# Altium footprint library PcbLib.PcbLib: 142 footprints (part 6 of 9)
Each footprint in its own frame and in the unit in brackets; x right, y up, seen from the top. Pads: shape width x height; smd on the part's side, far side on the other; paste and mask are expansions set on the pad; w line width, h text height; cw(c..) or ccw(c..) is an arc to the next point about the centre after c.
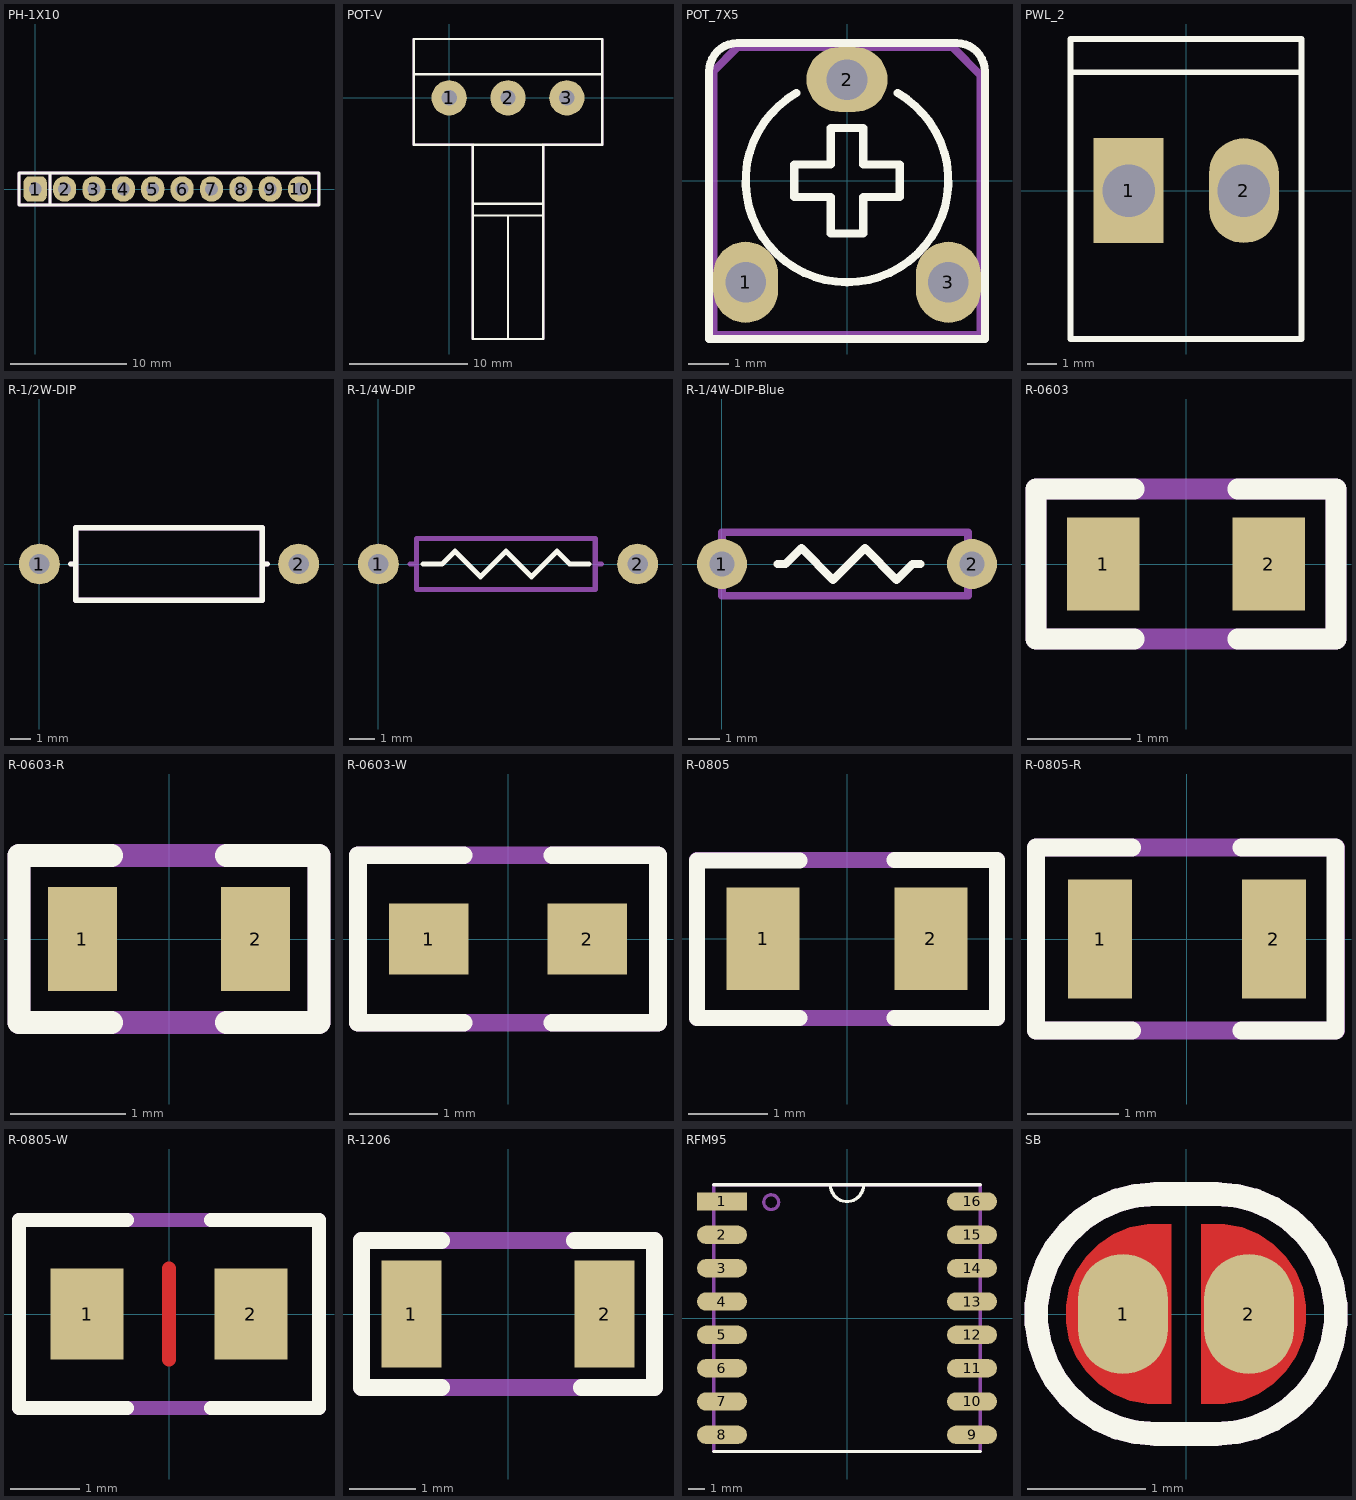
[diagram p5: the footprints below, top view; thin cyan lines are the x and y axes]

## PH-1X10 [mm] "2.54mm"
pads (10):
  rrect50% 2x2.2 hole 1.1: 1(0,0)
  oval 2x2.2 hole 1.1 mask+0.102: 2(2.54,0) 3(5.08,0) 4(7.62,0) 5(10.16,0) 6(12.7,0) 7(15.24,0) 8(17.78,0) 9(20.32,0) 10(22.86,0)
Top Overlay:
  lines w0.254: 1.275,-1.4 1.275,1.35 ; -1.4,-1.4 -1.4,1.4 24.536,1.4 24.536,-1.4 -1.4,-1.4
Mechanical 29:
  lines w0.254: 1.275,-1.4 1.275,1.35 ; -1.4,-1.4 24.511,-1.4 24.511,1.4 -1.4,1.4 -1.4,-1.4
  text ".Designator" at 3.9,-0.467 h1

## POT-V [mm]
pads (3):
  round 3 hole 1.3: 1(0,0) 2(5,0) 3(10,0)
Top Overlay:
  lines w0.2: -3,2 13,2 ; 2,-10 8,-10 ; 2,-4 2,-9 ; 5,-20.5 5,-10 ; 8,-4 8,-9 ; 2,-9 2,-20.5 8,-20.5 8,-9 ; 2,-9 8,-9 ; -3,-4 -3,5 13,5 13,-4 -3,-4
Mechanical 29:
  lines w0.2: -3,-4 2,-4 2,-20.5 8,-20.5 8,-4 13,-4 13,5 -3,5 -3,-4
  text ".Designator" at 3.2,-0.467 h1
3D body "User Library-Pot(2).STEP": height 21.14, standoff -3.5, extent -2.874,-20.632 12.874,4.926

## POT_7X5 [mm] "POT, TRIM, 7.5X5.0mm, pitch: 5.0mm"
pads (3):
  oval 1.6x2 hole 1: 1(-2.5,-2.5) 3(2.5,-2.5)
  oval 2x1.6 hole 1: 2(0,2.5)
Top Overlay:
  lines w0.2: -1.25,2.165 ccw(c0,0) 1.25,2.165 ; -3.4,-3.9 3.4,-3.9 3.4,2.7 ccw(c2.7,2.7) 2.7,3.4 -2.7,3.4 ccw(c-2.7,2.7) -3.4,2.7 -3.4,-3.9 ; -1.3,-0.4 -0.4,-0.4 -0.4,-1.3 0.4,-1.3 0.4,-0.4 1.3,-0.4 1.3,0.4 0.4,0.4 0.4,1.3 -0.4,1.3 -0.4,0.4 -1.3,0.4 -1.3,-0.4
Mechanical 29:
  lines w0.2: -3.3,-3.8 -3.3,2.7 -2.7,3.3 2.6,3.3 3.3,2.6 3.3,-3.8 -3.3,-3.8
  text ".Designator" at -1.3,-0.667 h1
3D body "User Library-Pot - RES_VAR1.STEP": height 7.5, standoff -3.4, extent -3.25,-3.775 3.25,3.275

## PWL_2 [mm] "Connector; Header; 2 Position"
height 0.001
pads (2):
  rect 2.4x3.6 hole 1.8: 1(-1.98,0)
  oval 2.4x3.6 hole 1.8: 2(1.98,0)
Top Overlay:
  lines w0.2: -3.98,4.064 3.96,4.064 ; -3.98,-5.1 -3.98,5.207 3.96,5.207 3.96,-5.1 -3.98,-5.1
3D body "PWL-2.stp": height 13.5, standoff -4, extent -3.96,-5 3.96,5

## R-1/2W-DIP [mm]
pads (2):
  round 2 hole 1: 1(0,0) 2(12.7,0)
Top Overlay:
  lines w0.254: 1.524,0 1.778,0 ; 10.922,0 11.176,0 ; 1.778,-1.778 1.778,1.778 10.922,1.778 10.922,-1.778 1.778,-1.778
Mechanical 29:
  lines w0.254: 1.524,0 1.778,0 ; 10.922,0 11.176,0 ; 1.778,-1.778 1.778,1.778 10.922,1.778 10.922,-1.778 1.778,-1.778
  text ".Designator" at 4.518,-0.483 h1
3D body "User Library-Res50-Axial 0_5W-22R.step": height 4.38, standoff -5, extent -0.375,-1.875 13.075,1.875

## R-1/4W-DIP [mm]
pads (2):
  round 1.6 hole 0.8 paste-2539.97 mask+0.04: 1(0,0) 2(10.16,0)
Top Overlay:
  lines w0.2: 1.75,0 2.5,0 3,0.5 4,-0.5 ; 8.25,0 7.5,0 ; 4,-0.5 5,0.5 6,-0.5 ; 4,-0.5 4,-0.5 ; 6,-0.5 7,0.5 7.5,0 ; 6,-0.5 6,-0.5 ; 7.5,0 7.5,0
Mechanical 29:
  lines w0.2: 1.25,0 1.5,0 ; 8.5,0 8.75,0 ; 1.5,-1 1.5,1 8.5,1 8.5,-1 1.5,-1
  text ".Designator" at 3.45,-0.467 h1
3D body "User Library-RESISTOR, 0_25 W, 0_4 IN LEAD PITCH.step": height 2.93, standoff -2.54, extent -0.305,-1.156 10.465,1.156

## R-1/4W-DIP-Blue [mm]
pads (2):
  round 1.6 hole 0.8 paste-2539.97 mask+0.04: 1(0,0) 2(8,0)
Top Overlay:
  lines w0.254: 1.778,0 2.032,0 2.54,0.508 3.556,-0.508 4.572,0.508 5.588,-0.508 6.096,0 6.35,0
Mechanical 29:
  lines w0.254: 0,-1.016 7.874,-1.016 7.874,1.016 1.778,1.016 0,1.016 0,-1.016
  text ".Designator" at 1.978,-0.483 h1
3D body "10KR.STEP": height 2.6, standoff -1.11, extent 0.015,-1.1 7.985,1.1

## R-0603 [mm]
pads (2):
  rect 0.7x0.9 smd: 1(-0.8,0) 2(0.8,0)
Top Overlay:
  lines w0.2: -0.5,-0.725 -1.45,-0.725 -1.45,0.725 -0.5,0.725 ; 0.5,-0.725 1.45,-0.725 1.45,0.725 0.5,0.725
Mechanical 29:
  lines w0.2: -1.45,-0.725 -1.45,0.725 1.45,0.725 1.45,-0.725 -1.45,-0.725
  text ".Designator" at -1.05,-0.467 h1
3D body "RES0603.stp": height 0.45, standoff 0, extent -0.8,-0.4 0.8,0.4

## R-0603-R [mm]
pads (2):
  rect 0.6x0.9 smd: 1(-0.75,0) 2(0.75,0)
Top Overlay:
  lines w0.2: -0.5,-0.725 -1.3,-0.725 -1.3,0.725 -0.5,0.725 ; 0.5,-0.725 1.3,-0.725 1.3,0.725 0.5,0.725
Mechanical 29:
  lines w0.2: -1.3,-0.725 1.3,-0.725 1.3,0.725 -1.3,0.725 -1.3,-0.725
  text ".Designator" at -1.05,-0.467 h1
3D body "RES0603.stp": height 0.45, standoff 0, extent -0.8,-0.4 0.8,0.4

## R-0603-W [mm]
pads (2):
  rect 0.9x0.8 smd: 1(-0.9,0) 2(0.9,0)
Top Overlay:
  lines w0.2: -0.5,-0.95 -1.7,-0.95 -1.7,0.95 -0.5,0.95 ; 0.5,-0.95 1.7,-0.95 1.7,0.95 0.5,0.95
Mechanical 29:
  lines w0.2: -1.7,-0.95 -1.7,0.95 1.7,0.95 1.7,-0.95 -1.7,-0.95
  text ".Designator" at -1.05,-0.467 h1
3D body "RES0603.stp": height 0.45, standoff 0, extent -0.8,-0.4 0.8,0.4

## R-0805 [mm]
pads (2):
  rect 0.925x1.3 smd: 1(-1.062,0) 2(1.062,0)
Top Overlay:
  lines w0.2: -0.6,-1.002 -1.9,-1.002 -1.9,0.993 -0.6,0.993 ; 0.6,-1.002 1.9,-1.002 1.9,1 0.6,1
Mechanical 29:
  lines w0.2: -1.9,-1 1.9,-1 1.9,1 -1.9,1 -1.9,-1
  text ".Designator" at -1.05,-0.467 h1
3D body "RES0805.stp": height 0.5, standoff 0, extent -1,-0.63 1,0.62

## R-0805-R [mm]
pads (2):
  rect 0.7x1.3 smd: 1(-0.95,0) 2(0.95,0)
Top Overlay:
  lines w0.2: -0.6,-1 -1.65,-1 -1.65,1 -0.6,1 ; 0.6,-1 1.625,-1 1.625,1 0.6,1
Mechanical 29:
  lines w0.2: -1.65,-1 1.63,-1 1.63,1 -1.65,1 -1.65,-1
  text ".Designator" at -1.05,-0.467 h1
3D body "RES0805.stp": height 0.5, standoff 0, extent -1,-0.63 1,0.62

## R-0805-W [mm]
pads (2):
  rect 1.05x1.3 smd: 1(-1.175,0) 2(1.175,0)
Top Layer:
  lines w0.2: 0,-0.65 0,0.65
Top Overlay:
  lines w0.2: -0.6,-1.35 -2.15,-1.35 -2.15,1.35 -0.6,1.35 ; 0.6,-1.35 2.15,-1.35 2.15,1.35 0.6,1.35
Mechanical 29:
  lines w0.2: -2.15,-1.35 2.15,-1.35 2.15,1.35 -2.15,1.35 -2.15,-1.35
  text ".Designator" at -1.05,-0.467 h1
3D body "RES0805.stp": height 0.5, standoff 0, extent -1,-0.63 1,0.62

## R-1206 [mm]
pads (2):
  rect 0.9x1.6 smd: 1(-1.45,0) 2(1.45,0)
Top Overlay:
  lines w0.254: -1,-1.1 -2.2,-1.1 -2.2,1.1 -1,1.1 ; 1,1.1 2.2,1.1 2.2,-1.1 1.1,-1.1
Mechanical 29:
  lines w0.254: -2.2,-1.1 2.2,-1.1 2.2,1.1 -2.2,1.1 -2.2,-1.1
  text ".Designator" at -0.996,-0.163 h1
3D body "RES1206.stp": height 0.55, standoff 0, extent -1.55,-0.772 1.55,0.78

## RFM95 [mm]
pads (16):
  rect 3x1.1 smd: 1(-7.5,7)
  oval 3x1.1 smd: 2(-7.5,5) 3(-7.5,3) 4(-7.5,1) 5(-7.5,-1) 6(-7.5,-3) 7(-7.5,-5) 8(-7.5,-7) 9(7.5,-7) 10(7.5,-5) 11(7.5,-3) 12(7.5,-1) 13(7.5,1) 14(7.5,3) 15(7.5,5) 16(7.5,7)
Top Overlay:
  lines w0.2: -8,-8 8,-8 ; -8,8 8,8 ; -1,8 ccw(c0,8) 1,8
Mechanical 29:
  circle w0.2: c-4.547,6.96 r0.444
  lines w0.2: -8,-8 8,-8 8,8 -8,8 -8,-8
  text ".Designator" at 0.934,-4.6 h2
3D body "RFM95 LoRa v15.step": height 2.04, standoff 0, extent -8,-8 8,8

## SB [mil] "SOLDER BRIDGE NO"
pads (2):
  oval 30x40 smd mask+0: 1(-21,0) 2(21,0)
Top Layer:
  region: -10,-30 -12.95,-30 -18.75,-28.85 -24.21,-26.59 -29.12,-23.3 -33.3,-19.12 -36.59,-14.21 -38.85,-8.75 -40,-2.95 -40,0 -40,2.95 -38.85,8.75 -36.59,14.21 -33.3,19.12 -29.12,23.3 -24.21,26.59 -18.75,28.85 -12.95,30 -10,30 -5,30 -5,-30
  region: 5,-30 5,30 10,30 12.95,30 18.75,28.85 24.21,26.59 29.12,23.3 33.3,19.12 36.59,14.21 38.85,8.75 40,2.95 40,0 40,-2.95 38.85,-8.75 36.59,-14.21 33.3,-19.12 29.12,-23.3 24.21,-26.59 18.75,-28.85 12.95,-30 10,-30
Top Overlay:
  lines w7.87: -10,-40 cw(c-10,0) -10,40 10,40 cw(c10,0) 10,-40 -10,-40
Top Solder:
  rectangle: -6.5,-34.25 6.5,34.25
Mechanical 29:
  lines w7.87: -10,-40 cw(c-10,0) -10,40 10,40 cw(c10,0) 10,-40 -10,-40
  text ".Designator" at -31.06,-9.5 h19.68